# Altium footprint library EwgActive.PCBLIB: 47 footprints (part 2 of 3)
Each footprint in its own frame and in the unit in brackets; x right, y up, seen from the top. Pads: shape width x height; smd on the part's side, far side on the other; paste and mask are expansions set on the pad; w line width, h text height; cw(c..) or ccw(c..) is an arc to the next point about the centre after c.
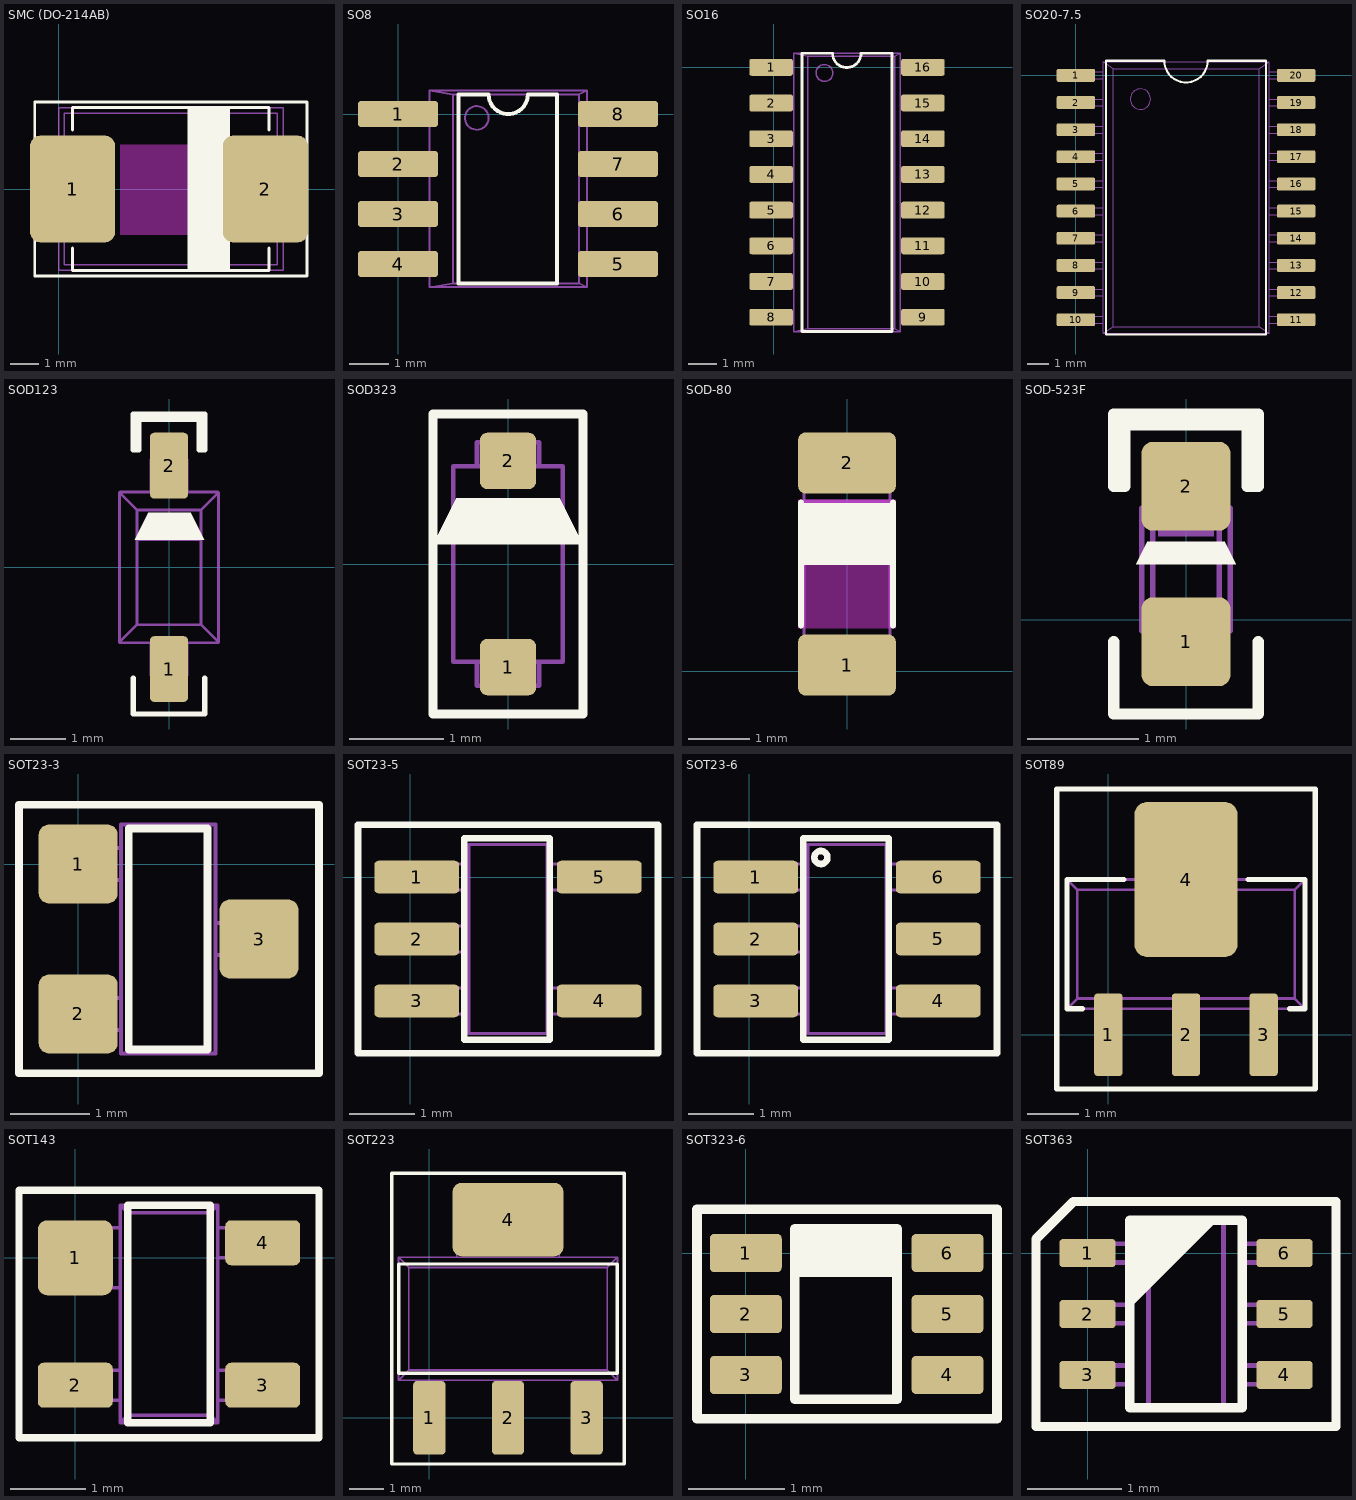
[diagram p1: the footprints below, top view; thin cyan lines are the x and y axes]

## SMC (DO-214AB) [mm]
height 2.65
pads (2):
  rrect25% 3.03x3.82 smd: 1(0.5,0) 2(7.37,0)
Top Overlay:
  region: 4.6,2.9 4.6,-2.9 6.1,-2.9 6.1,2.9
  lines w0.1: 0.5,-2.1 0.5,-2.9 7.5,-2.9 7.5,-2.1 ; 0.5,2.1 0.5,2.9 7.5,2.9 7.5,2.1 ; -0.85,-3.1 8.85,-3.1 8.85,3.1 -0.85,3.1 -0.85,-3.1
Keep-Out Layer:
  region: 2.2,-1.625 5.7,-1.625 5.7,1.575 2.2,1.575
Mechanical 1:
  lines w0.05: 0,-2.9 8,-2.9 8,2.9 0,2.9 0,0 0,-2.9 ; 0.2,-2.7 7.8,-2.7 7.8,-1.3 cw(c7.8,0) 7.8,1.3 7.8,2.7 0.2,2.7 0.2,-2.7
3D body: height 2.3, standoff 0, extent 0.03,-2.95 7.98,2.95

## SO8 [mil]
pads (8):
  rrect25% 80x26 smd: 1(0,0) 2(0,-50) 3(0,-100) 4(0,-150) 5(220,-150) 6(220,-100) 7(220,-50) 8(220,0)
Top Overlay:
  lines w3.94: 60.63,-169.29 60.63,19.68 72.05,19.68 90.55,19.68 ccw(c110.24,19.68) 129.92,19.68 147.64,19.68 159.06,19.68 159.06,-169.29 60.63,-169.29
Mechanical 1:
  circle w1.97: c78.74,-3.94 r11.81
  lines w1.97: 7.87,-157.87 7.87,-142.13 ; 7.87,-107.87 7.87,-92.13 ; 7.87,-57.87 7.87,-42.13 ; 7.87,-7.87 7.87,7.87 ; 31.5,-157.87 -15.75,-157.87 -15.75,-142.13 31.5,-142.13 ; 31.5,-107.87 -15.75,-107.87 -15.75,-92.13 31.5,-92.13 ; 31.5,-57.87 -15.75,-57.87 -15.75,-42.13 31.5,-42.13 ; 31.5,-7.87 -15.75,-7.87 -15.75,7.87 31.5,7.87 ; 188.98,-157.87 236.22,-157.87 236.22,-142.13 188.98,-142.13 ; 188.98,-107.87 236.22,-107.87 236.22,-92.13 188.98,-92.13 ; 188.98,-57.87 236.22,-57.87 236.22,-42.13 188.98,-42.13 ; 188.98,-7.87 236.22,-7.87 236.22,7.87 188.98,7.87 ; 212.6,-157.87 212.6,-142.13 ; 212.6,-107.87 212.6,-92.13 ; 212.6,-57.87 212.6,-42.13 ; 212.6,-7.87 212.6,7.87 ; 31.5,-173.23 55.12,-169.29 ; 31.5,-173.23 31.5,23.62 ; 31.5,-173.23 188.98,-173.23 ; 31.5,23.62 55.12,19.68 ; 31.5,23.62 188.98,23.62 ; 55.12,-169.29 55.12,19.68 ; 55.12,-169.29 181.1,-169.29 ; 55.12,19.68 181.1,19.68 ; 181.1,-169.29 188.98,-173.23 ; 181.1,-169.29 181.1,19.68 ; 181.1,19.68 188.98,23.62 ; 188.98,-173.23 188.98,23.62
3D body: height 68.9, standoff 0.01, extent -8.09,-173.23 228.58,23.62

## SO16 [mm]
pads (16):
  rrect25% 1.55x0.6 smd: 1(-0.1,0) 2(-0.1,-1.27) 3(-0.1,-2.54) 4(-0.1,-3.81) 5(-0.1,-5.08) 6(-0.1,-6.35) 7(-0.1,-7.62) 8(-0.1,-8.89) 9(5.3,-8.89) 10(5.3,-7.62) 11(5.3,-6.35) 12(5.3,-5.08) 13(5.3,-3.81) 14(5.3,-2.54) 15(5.3,-1.27) 16(5.3,0)
Top Overlay:
  lines w0.1: 1,-9.4 4.2,-9.4 4.2,0.5 3.363,0.5 3.1,0.5 cw(c2.592,0.5) 2.084,0.5 1.837,0.5 1,0.5 1,-9.4
Mechanical 1:
  circle w0.05: c1.8,-0.2 r0.3
  lines w0.05: 0.1,-9.09 0.1,-8.69 ; 0.1,-7.82 0.1,-7.42 ; 0.1,-6.55 0.1,-6.15 ; 0.1,-5.28 0.1,-4.88 ; 0.1,-4.01 0.1,-3.61 ; 0.1,-2.74 0.1,-2.34 ; 0.1,-1.47 0.1,-1.07 ; 0.1,-0.2 0.1,0.2 ; 0.7,-9.09 -0.4,-9.09 -0.4,-8.69 0.7,-8.69 ; 0.7,-7.82 -0.4,-7.82 -0.4,-7.42 0.7,-7.42 ; 0.7,-6.55 -0.4,-6.55 -0.4,-6.15 0.7,-6.15 ; 0.7,-5.28 -0.4,-5.28 -0.4,-4.88 0.7,-4.88 ; 0.7,-4.01 -0.4,-4.01 -0.4,-3.61 0.7,-3.61 ; 0.7,-2.74 -0.4,-2.74 -0.4,-2.34 0.7,-2.34 ; 0.7,-1.47 -0.4,-1.47 -0.4,-1.07 0.7,-1.07 ; 0.7,-0.2 -0.4,-0.2 -0.4,0.2 0.7,0.2 ; 4.5,-9.09 5.6,-9.09 5.6,-8.69 4.5,-8.69 ; 4.5,-7.82 5.6,-7.82 5.6,-7.42 4.5,-7.42 ; 4.5,-6.55 5.6,-6.55 5.6,-6.15 4.5,-6.15 ; 4.5,-5.28 5.6,-5.28 5.6,-4.88 4.5,-4.88 ; 4.5,-4.01 5.6,-4.01 5.6,-3.61 4.5,-3.61 ; 4.5,-2.74 5.6,-2.74 5.6,-2.34 4.5,-2.34 ; 4.5,-1.47 5.6,-1.47 5.6,-1.07 4.5,-1.07 ; 4.5,-0.2 5.6,-0.2 5.6,0.2 4.5,0.2 ; 5.1,-9.09 5.1,-8.69 ; 5.1,-7.82 5.1,-7.42 ; 5.1,-6.55 5.1,-6.15 ; 5.1,-5.28 5.1,-4.88 ; 5.1,-4.01 5.1,-3.61 ; 5.1,-2.74 5.1,-2.34 ; 5.1,-1.47 5.1,-1.07 ; 5.1,-0.2 5.1,0.2 ; 0.7,-9.4 4.5,-9.4 ; 0.7,-9.4 0.7,0.5 ; 0.7,-9.4 1.2,-9.3 ; 0.7,0.5 4.5,0.5 ; 0.7,0.5 1.2,0.4 ; 1.2,-9.3 4.3,-9.3 ; 1.2,-9.3 1.2,0.4 ; 1.2,0.4 4.3,0.4 ; 4.3,-9.3 4.3,0.4 ; 4.3,-9.3 4.5,-9.4 ; 4.3,0.4 4.5,0.5 ; 4.5,-9.4 4.5,0.5
3D body: height 1.7, standoff -0.05, extent -0.525,-9.45 5.675,0.55

## SO20-7.5 [mm]
pads (20):
  rrect25% 1.8x0.6 smd: 1(0,0) 2(0,-1.27) 3(0,-2.54) 4(0,-3.81) 5(0,-5.08) 6(0,-6.35) 7(0,-7.62) 8(0,-8.89) 9(0,-10.16) 10(0,-11.43) 11(10.3,-11.43) 12(10.3,-10.16) 13(10.3,-8.89) 14(10.3,-7.62) 15(10.3,-6.35) 16(10.3,-5.08) 17(10.3,-3.81) 18(10.3,-2.54) 19(10.3,-1.27) 20(10.3,0)
Top Overlay:
  lines w0.1: 1.4,-12.115 1.4,0.685 4.134,0.685 ccw(c5.15,0.685) 6.166,0.685 8.9,0.685 8.9,-12.115 1.4,-12.115
Mechanical 1:
  circle w0.05: c3.016,-1.111 r0.476
  lines w0.05: 0.635,-11.589 0.635,-11.271 ; 0.635,-10.319 0.635,-10.001 ; 0.635,-9.049 0.635,-8.731 ; 0.635,-7.779 0.635,-7.461 ; 0.635,-6.509 0.635,-6.191 ; 0.635,-5.239 0.635,-4.921 ; 0.635,-3.969 0.635,-3.651 ; 0.635,-2.699 0.635,-2.381 ; 0.635,-1.429 0.635,-1.111 ; 0.635,-0.159 0.635,0.159 ; 1.27,-11.589 0,-11.589 0,-11.271 1.27,-11.271 ; 1.27,-10.319 0,-10.319 0,-10.001 1.27,-10.001 ; 1.27,-9.049 0,-9.049 0,-8.731 1.27,-8.731 ; 1.27,-7.779 0,-7.779 0,-7.461 1.27,-7.461 ; 1.27,-6.509 0,-6.509 0,-6.191 1.27,-6.191 ; 1.27,-5.239 0,-5.239 0,-4.921 1.27,-4.921 ; 1.27,-3.969 0,-3.969 0,-3.651 1.27,-3.651 ; 1.27,-2.699 0,-2.699 0,-2.381 1.27,-2.381 ; 1.27,-1.429 0,-1.429 0,-1.111 1.27,-1.111 ; 1.27,-0.159 0,-0.159 0,0.159 1.27,0.159 ; 9.049,-11.589 10.319,-11.589 10.319,-11.271 9.049,-11.271 ; 9.049,-10.319 10.319,-10.319 10.319,-10.001 9.049,-10.001 ; 9.049,-9.049 10.319,-9.049 10.319,-8.731 9.049,-8.731 ; 9.049,-7.779 10.319,-7.779 10.319,-7.461 9.049,-7.461 ; 9.049,-6.509 10.319,-6.509 10.319,-6.191 9.049,-6.191 ; 9.049,-5.239 10.319,-5.239 10.319,-4.921 9.049,-4.921 ; 9.049,-3.969 10.319,-3.969 10.319,-3.651 9.049,-3.651 ; 9.049,-2.699 10.319,-2.699 10.319,-2.381 9.049,-2.381 ; 9.049,-1.429 10.319,-1.429 10.319,-1.111 9.049,-1.111 ; 9.049,-0.159 10.319,-0.159 10.319,0.159 9.049,0.159 ; 9.684,-11.589 9.684,-11.271 ; 9.684,-10.319 9.684,-10.001 ; 9.684,-9.049 9.684,-8.731 ; 9.684,-7.779 9.684,-7.461 ; 9.684,-6.509 9.684,-6.191 ; 9.684,-5.239 9.684,-4.921 ; 9.684,-3.969 9.684,-3.651 ; 9.684,-2.699 9.684,-2.381 ; 9.684,-1.429 9.684,-1.111 ; 9.684,-0.159 9.684,0.159 ; 1.27,-12.065 1.746,-11.747 ; 1.27,-12.065 1.27,0.635 ; 1.27,-12.065 9.049,-12.065 ; 1.27,0.635 1.746,0.318 ; 1.27,0.635 9.049,0.635 ; 1.746,-11.747 1.746,0.318 ; 1.746,-11.747 8.572,-11.747 ; 1.746,0.318 8.572,0.318 ; 8.572,-11.747 9.049,-12.065 ; 8.572,-11.747 8.572,0.318 ; 8.572,0.318 9.049,0.635 ; 9.049,-12.065 9.049,0.635
3D body: height 2.57, standoff -0.03, extent -0.1,-12.25 10.5,0.75

## SOD123 [mm]
pads (2):
  rrect25% 0.7x1.2 smd: 1(0,-1.85) 2(0,1.85)
Top Overlay:
  region: -0.626,0.5 0.639,0.5 0.394,0.991 -0.381,0.991
  lines w0.1: -0.65,-2.017 -0.65,-2.667 0.65,-2.667 0.65,-2.017 ; -0.65,2.74 0.65,2.74 ; -0.65,2.14 -0.65,2.79 0.65,2.79 0.65,2.14 0.55,2.14 0.55,2.69 -0.55,2.69 -0.55,2.14 -0.65,2.14
Mechanical 1:
  lines w0.05: -0.894,-1.366 -0.894,-1.352 -0.584,-1.041 ; -0.894,1.366 -0.894,1.352 -0.584,1.041 ; -0.559,0.508 0.559,0.508 ; -0.33,-1.397 -0.33,-1.956 0,-1.956 0.33,-1.956 0.33,-1.397 ; -0.33,1.397 -0.33,1.956 0,1.956 0.33,1.956 0.33,1.397 ; 0.894,-1.366 0.894,-1.352 0.584,-1.041 ; 0.894,1.366 0.894,1.352 0.584,1.041 ; -0.584,-1.041 -0.584,0 -0.584,1.041 ; -0.584,-1.041 0,-1.041 0.584,-1.041 ; -0.584,1.041 0,1.041 0.584,1.041 ; 0.584,-1.041 0.584,0 0.584,1.041 ; -0.9,-1.361 -0.889,-1.372 0,-1.372 0.889,-1.372 0.9,-1.361 0.9,0 0.9,1.361 0.889,1.372 0,1.372 -0.889,1.372 -0.9,1.361 -0.9,0 -0.9,-1.361
3D body: height 1.18, standoff 0, extent -0.9,-1.95 0.9,1.95

## SOD323 [mm]
pads (2):
  rrect25% 0.6x0.6 smd: 1(0,-1.1) 2(0,1.1)
Top Overlay:
  region: -0.795,0.209 0.795,0.209 0.55,0.7 -0.55,0.7
  lines w0.1: -0.8,-1.6 -0.8,1.6 0.8,1.6 0.8,-1.6 -0.8,-1.6
Mechanical 1:
  lines w0.05: -0.559,0.508 0.559,0.508 ; -0.33,-1.041 -0.33,-1.3 0,-1.3 0.33,-1.3 0.33,-1.041 ; -0.33,1.041 -0.33,1.3 0,1.3 0.33,1.3 0.33,1.041 ; -0.584,-1.041 -0.584,0 -0.584,1.041 0,1.041 0.584,1.041 0.584,0 0.584,-1.041 0,-1.041 -0.584,-1.041
3D body: height 1.1, standoff 0, extent -0.675,-1.3 0.675,1.3

## SOD-80 [mm]
pads (2):
  rrect25% 1.6x1 smd: 1(0,0.1) 2(0,3.4)
Top Layer keep-out:
  region: -0.8,0.7 0.8,0.7 0.8,2.8 -0.8,2.8
Top Overlay:
  region: 0.8,2.74 -0.8,2.74 -0.8,1.74 0.8,1.74
  lines w0.1: -0.75,0.75 -0.75,2.75 ; 0.75,0.75 0.75,2.75
Mechanical 1:
  region: -0.7,2.3 0.7,2.3 0.7,2.8 -0.7,2.8
  lines w0.05: -0.5,0.4 cw(c-0.5,0.6) -0.7,0.6 -0.7,2.9 cw(c-0.5,2.9) -0.5,3.1 ; 0.5,0.4 ccw(c0.5,0.6) 0.7,0.6 0.7,2.9 ccw(c0.5,2.9) 0.5,3.1 ; -0.75,0.1 -0.75,0.4 0.75,0.4 0.75,0.1 -0.75,0.1 ; -0.75,3.1 -0.75,3.4 0.75,3.4 0.75,3.1 -0.75,3.1
3D body: height 1.5, standoff 0, extent -0.75,0 0.75,3.5

## SOD-523F [mm]
pads (2):
  rrect25% 0.8x0.8 smd: 1(0,-0.2) 2(0,1.2)
Top Overlay:
  region: -0.45,0.5 0.45,0.5 0.35,0.7 -0.35,0.7
  lines w0.1: -0.65,-0.2 -0.65,-0.85 0.65,-0.85 0.65,-0.2 ; -0.65,1.8 0.65,1.8 ; -0.65,1.2 -0.55,1.2 -0.55,1.75 0.55,1.75 0.55,1.2 0.65,1.2 0.65,1.85 -0.65,1.85 -0.65,1.2
Mechanical 1:
  region: -0.25,0.75 0.25,0.75 0.25,0.85 -0.25,0.85
  lines w0.05: -0.4,-0.1 -0.3,0 ; -0.4,-0.1 -0.4,1 ; -0.4,-0.1 0,-0.1 0.4,-0.1 ; -0.4,1 -0.3,0.9 ; -0.4,1 0.4,1 ; -0.3,0 0.3,0 ; -0.3,0 -0.3,0.9 ; -0.3,0.9 0.3,0.9 ; 0.3,0 0.4,-0.1 ; 0.3,0 0.3,0.9 ; 0.3,0.9 0.4,1 ; 0.4,-0.1 0.4,1 ; -0.15,-0.3 -0.15,-0.1 0.15,-0.1 0.15,-0.3 -0.15,-0.3 ; -0.15,1 -0.15,1.2 0.15,1.2 0.15,1 -0.15,1
3D body: height 0.7, standoff 0, extent -0.399,-0.3 0.399,1.3

## SOT23-3 [mm]
pads (3):
  rrect25% 1x1 smd: 1(0,0) 2(0,-1.9) 3(2.29,-0.95)
Top Overlay:
  lines w0.1: -0.75,-2.65 -0.75,0.75 3.05,0.75 3.05,-2.65 -0.75,-2.65 ; 0.64,-2.35 1.64,-2.35 1.64,0.45 0.64,0.45 0.64,-2.35
Mechanical 1:
  lines w0.05: 0.24,-2.1 0.24,-1.7 ; 0.24,-0.2 0.24,0.2 ; 0.54,-2.1 0.04,-2.1 0.04,-1.7 0.54,-1.7 ; 0.54,-0.2 0.04,-0.2 0.04,0.2 0.54,0.2 ; 1.74,-1.15 2.24,-1.15 2.24,-0.75 1.74,-0.75 ; 2.04,-1.15 2.04,-0.75 ; 0.54,-2.4 1.74,-2.4 1.74,0.5 0.54,0.5 0.54,-2.4
3D body: height 0.97, standoff -0.01, extent -0.149,-2.41 2.399,0.51

## SOT23-5 [mm]
pads (5):
  rrect25% 1.3x0.5 smd mask+0.05: 1(0.1,0) 2(0.1,-0.95) 3(0.1,-1.9) 4(2.9,-1.9) 5(2.9,0)
Top Overlay:
  lines w0.1: -0.8,-2.7 -0.8,0.8 3.8,0.8 3.8,-2.7 -0.8,-2.7 ; 0.831,-2.494 2.137,-2.494 2.137,0.594 0.831,0.594 0.831,-2.494
Mechanical 1:
  lines w0.05: 0.596,-2.1 0.596,-1.7 ; 0.596,-1.15 0.596,-0.75 ; 0.596,-0.2 0.596,0.2 ; 0.896,-2.1 0.396,-2.1 0.396,-1.7 0.896,-1.7 ; 0.896,-1.15 0.396,-1.15 0.396,-0.75 0.896,-0.75 ; 0.896,-0.2 0.396,-0.2 0.396,0.2 0.896,0.2 ; 2.096,-2.1 2.596,-2.1 2.596,-1.7 2.096,-1.7 ; 2.096,-0.2 2.596,-0.2 2.596,0.2 2.096,0.2 ; 2.396,-2.1 2.396,-1.7 ; 2.396,-0.2 2.396,0.2 ; 0.896,-2.4 2.096,-2.4 2.096,0.5 0.896,0.5 0.896,-2.4
3D body: height 1.45, standoff -0.01, extent 0,-2.45 3,0.55

## SOT23-6 [mm]
pads (6):
  rrect25% 1.3x0.5 smd mask+0.05: 1(0.1,0) 2(0.1,-0.95) 3(0.1,-1.9) 4(2.9,-1.9) 5(2.9,-0.95) 6(2.9,0)
Top Overlay:
  circle w0.1: c1.1,0.3 r0.1
  lines w0.1: -0.8,-2.7 3.8,-2.7 3.8,0.8 -0.8,0.8 -0.8,-2.7 ; 0.831,-2.494 0.831,0.594 2.137,0.594 2.137,-2.494 0.831,-2.494
Mechanical 1:
  lines w0.05: 0.596,-2.1 0.596,-1.7 ; 0.596,-1.15 0.596,-0.75 ; 0.596,-0.2 0.596,0.2 ; 0.896,-2.1 0.396,-2.1 0.396,-1.7 0.896,-1.7 ; 0.896,-1.15 0.396,-1.15 0.396,-0.75 0.896,-0.75 ; 0.896,-0.2 0.396,-0.2 0.396,0.2 0.896,0.2 ; 2.096,-2.1 2.596,-2.1 2.596,-1.7 2.096,-1.7 ; 2.096,-0.2 2.596,-0.2 2.596,0.2 2.096,0.2 ; 2.396,-2.1 2.396,-1.7 ; 2.396,-0.2 2.396,0.2 ; 0.896,-2.4 0.896,0.5 2.096,0.5 2.096,-2.4 0.896,-2.4
3D body: height 1.4, standoff 0, extent -0.016,-2.494 2.984,0.554

## SOT89 [mm]
pads (4):
  rrect25% 0.55x1.6 smd: 1(0,0) 2(1.5,0) 3(3,0)
  rrect25% 2x3 smd: 4(1.5,3)
Top Overlay:
  lines w0.1: -0.5,0.5 -0.8,0.5 -0.8,3 0.3,3 ; 2.7,3 3.8,3 3.8,0.5 3.5,0.5 ; -1,-1.05 4,-1.05 4,4.75 -1,4.75 -1,-1.05
Mechanical 1:
  lines w0.05: -0.2,0.5 -0.2,-0.3 0.2,-0.3 0.2,0.5 ; 0.7,3 0.7,3.5 1.1,3.9 1.9,3.9 2.3,3.5 2.3,3 ; 1.3,0.5 1.3,-0.3 1.7,-0.3 1.7,0.5 ; 2.8,0.5 2.8,-0.3 3.2,-0.3 3.2,0.5 ; -0.8,0.5 -0.8,3 ; -0.8,0.5 -0.6,0.7 ; -0.8,0.5 3.8,0.5 ; -0.8,3 -0.6,2.8 ; -0.8,3 3.8,3 ; -0.6,0.7 -0.6,2.8 ; -0.6,0.7 3.6,0.7 ; -0.6,2.8 3.6,2.8 ; 3.6,0.7 3.8,0.5 ; 3.6,0.7 3.6,0.8 3.6,2.8 ; 3.6,2.8 3.8,3 ; 3.8,0.5 3.8,3
3D body: height 1.51, standoff 0, extent -0.75,-0.35 3.75,3.95

## SOT143 [mm]
pads (4):
  rrect25% 1x1 smd: 1(0,0)
  rrect25% 1x0.6 smd: 2(0,-1.7) 3(2.5,-1.7) 4(2.5,0.2)
Top Overlay:
  lines w0.1: -0.75,-2.4 3.25,-2.4 3.25,0.9 -0.75,0.9 -0.75,-2.4 ; 0.7,-2.2 1.8,-2.2 1.8,0.7 0.7,0.7 0.7,-2.2
Mechanical 1:
  lines w0.05: 0.3,-1.9 0.3,-1.5 ; 0.3,-0.4 0.3,0.4 ; 0.6,-1.9 0,-1.9 0,-1.5 0.6,-1.5 ; 0.6,-0.4 0,-0.4 0,0.4 0.6,0.4 ; 1.9,-1.9 2.5,-1.9 2.5,-1.5 1.9,-1.5 ; 1.9,0 2.5,0 2.5,0.4 1.9,0.4 ; 2.2,-1.9 2.2,-1.5 ; 2.2,0 2.2,0.4 ; 0.6,-2.2 1.9,-2.2 ; 0.6,-2.2 0.6,0.7 ; 0.6,-2.2 0.7,-2.1 ; 0.6,0.7 1.9,0.7 ; 0.6,0.7 0.7,0.6 ; 0.7,-2.1 1.8,-2.1 ; 0.7,-2.1 0.7,0.6 ; 0.7,0.6 1.8,0.6 ; 1.8,-2.1 1.9,-2.2 ; 1.8,-2.1 1.8,0.6 ; 1.8,0.6 1.9,0.7 ; 1.9,-2.2 1.9,0.7
3D body: height 1, standoff 0, extent 0.03,-2.21 2.45,0.71

## SOT223 [mm]
pads (4):
  rrect25% 0.95x2.15 smd: 1(0,0) 2(2.3,0) 3(4.6,0)
  rrect25% 3.25x2.15 smd: 4(2.3,5.8)
Top Overlay:
  lines w0.1: -1.1,-1.35 5.7,-1.35 5.7,7.15 -1.1,7.15 -1.1,-1.35 ; -0.9,1.3 -0.9,4.5 5.5,4.5 5.5,1.3 -0.9,1.3
Mechanical 1:
  lines w0.05: -0.4,0 0.4,0 ; -0.4,1.1 -0.4,-0.6 0.4,-0.6 0.4,1.1 ; 0.8,4.7 0.8,6.4 3.8,6.4 3.8,4.7 ; 0.8,5.6 3.8,5.6 ; 1.9,0 2.7,0 ; 1.9,1.1 1.9,-0.6 2.7,-0.6 2.7,1.1 ; 4.2,0 5,0 ; 4.2,1.1 4.2,-0.6 5,-0.6 5,1.1 ; -0.9,1.1 -0.9,4.7 ; -0.9,1.1 -0.6,1.4 ; -0.9,1.1 5.5,1.1 ; -0.9,4.7 -0.6,4.4 ; -0.9,4.7 5.5,4.7 ; -0.6,1.4 -0.6,4.4 ; -0.6,1.4 5.2,1.4 ; -0.6,4.4 5.2,4.4 ; 5.2,1.4 5.2,4.4 ; 5.2,1.4 5.5,1.1 ; 5.2,4.4 5.5,4.7 ; 5.5,1.1 5.5,4.7
3D body: height 1.64, standoff -0.01, extent -0.94,-0.6 5.56,6.4

## SOT323-6 [mm]
pads (6):
  rrect25% 0.75x0.4 smd mask+0.05: 1(0,0) 2(0,-0.635) 3(0,-1.27) 4(2.1,-1.27) 5(2.1,-0.635) 6(2.1,0)
Top Overlay:
  rectangle: 0.508,-0.25 1.575,0.254
  lines w0.1: -0.508,-1.727 2.616,-1.727 2.616,0.457 -0.508,0.457 -0.508,-1.727 ; 0.508,-1.524 0.508,0.254 1.575,0.254 1.575,-1.524 0.508,-1.524
3D body: height 0.95, standoff 0, extent -0.009,-1.644 2.091,0.356

## SOT363 [mm]
pads (6):
  rrect25% 0.6x0.3 smd: 1(0,0) 2(0,-0.65) 3(0,-1.3) 4(2.1,-1.3) 5(2.1,-0.65) 6(2.1,0)
Top Overlay:
  region: 0.44,-0.6 1.34,0.3 0.44,0.3
  lines w0.1: -0.55,-1.85 2.65,-1.85 2.65,0.55 -0.15,0.55 -0.55,0.15 -0.55,-1.85 ; 0.45,-1.65 1.65,-1.65 1.65,0.35 0.45,0.35 0.45,-1.65
Mechanical 1:
  lines w0.05: 0.2,-1.4 0.2,-1.2 ; 0.2,-0.75 0.2,-0.55 ; 0.2,-0.1 0.2,0.1 ; 0.45,-1.4 0,-1.4 0,-1.2 0.45,-1.2 ; 0.45,-0.75 0,-0.75 0,-0.55 0.45,-0.55 ; 0.45,-0.1 0,-0.1 0,0.1 0.45,0.1 ; 0.65,-1.65 0.65,0.35 ; 1.45,-1.65 1.45,0.35 ; 1.65,-1.4 2.1,-1.4 2.1,-1.2 1.65,-1.2 ; 1.65,-0.75 2.1,-0.75 2.1,-0.55 1.65,-0.55 ; 1.65,-0.1 2.1,-0.1 2.1,0.1 1.65,0.1 ; 1.9,-1.4 1.9,-1.2 ; 1.9,-0.75 1.9,-0.55 ; 1.9,-0.1 1.9,0.1 ; 0.45,-1.65 1.65,-1.65 1.65,0.35 0.45,0.35 0.45,-1.65
3D body: height 1, standoff 0, extent -0.1,-1.675 2.2,0.425